# Altium footprint library PcbLib.PcbLib: 154 footprints (part 4 of 10)
Each footprint in its own frame and in the unit in brackets; x right, y up, seen from the top. Pads: shape width x height; smd on the part's side, far side on the other; paste and mask are expansions set on the pad; w line width, h text height; cw(c..) or ccw(c..) is an arc to the next point about the centre after c.
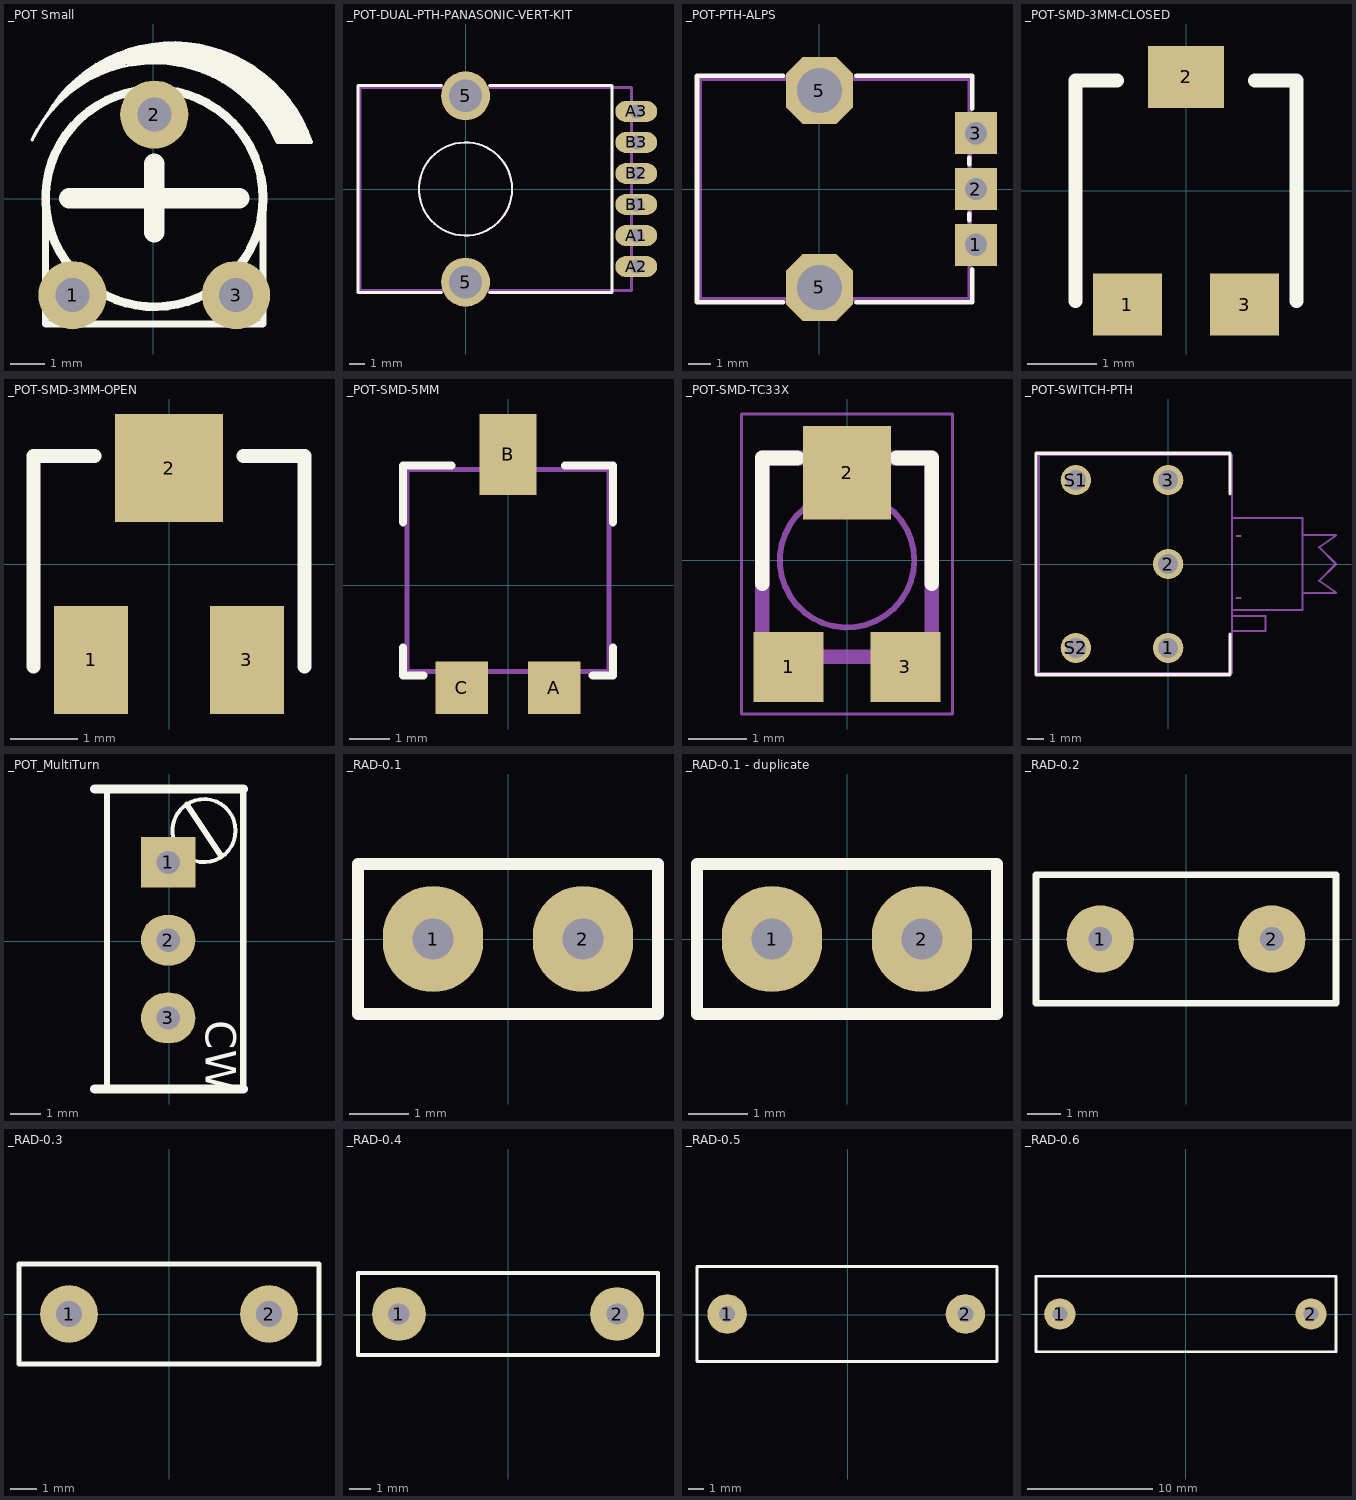
[diagram p3: the footprints below, top view; thin cyan lines are the x and y axes]

## _POT Small [mm]
pads (3):
  round 2 hole 1: 1(-2.375,-2.828) 2(0.025,2.472) 3(2.425,-2.828)
Top Overlay:
  circle w0.254: c0.025,0.022 r3.19
  lines w0.1: -3.557,1.733 cw(c0.025,0.022) 3.644,1.655 4.621,1.655 ; -3.141,2.43 cw(c0.572,0.288) 4.635,1.652 ; -2.725,2.955 -2.455,3.202 ; -2.525,3.222 -2.385,3.222 ; -2.455,3.292 -2.265,3.292 ; -2.375,3.382 -2.135,3.382 ; -2.285,3.472 -1.985,3.472 ; -2.155,3.562 -1.805,3.562 ; -2.065,3.652 -1.605,3.652 ; -1.935,3.742 -1.415,3.742 ; -1.845,3.822 -1.145,3.822 ; -1.695,3.912 -0.845,3.912 ; -1.565,4.002 2.673,4.002 ; -1.385,4.092 2.513,4.092 ; -1.225,4.172 2.343,4.182 ; -1.045,4.252 2.163,4.262 ; -0.815,4.342 1.943,4.342 ; -0.495,4.432 1.593,4.432 ; -0.145,4.492 1.263,4.492 ; 0.835,3.912 2.823,3.912 ; 1.185,3.822 2.963,3.822 ; 1.435,3.732 3.083,3.732 ; 1.675,3.642 3.203,3.642 ; 1.865,3.552 3.313,3.552 ; 2.165,3.372 3.503,3.372 ; 2.325,3.282 3.603,3.282 ; 2.565,3.102 3.743,3.102 ; 2.785,2.932 3.903,2.932 ; 2.955,2.742 3.993,2.742 ; 3.075,2.672 4.053,2.672 ; 3.115,2.602 4.093,2.602 ; 3.175,2.532 4.153,2.532 ; 3.235,2.452 4.213,2.452 ; 3.345,2.262 4.323,2.262 ; 3.415,2.172 4.393,2.172 ; 3.445,2.082 4.423,2.082 ; 3.495,1.992 4.473,1.992 ; 3.525,1.912 4.503,1.912 ; 3.575,1.822 4.553,1.822 ; 3.605,1.742 4.583,1.742
  lines w0.12: 2.025,3.462 3.433,3.462 ; 2.445,3.192 3.683,3.192 ; 2.705,3.022 3.823,3.022 ; 2.845,2.842 3.963,2.842
  lines w0.15: 3.285,2.362 4.263,2.362
  lines w0.2: -3.165,0.222 -3.165,-3.678 3.215,-3.678 3.215,0.222
  lines w0.6: -2.475,0.022 2.525,0.022 ; 0.025,-0.978 0.025,1.022

## _POT-DUAL-PTH-PANASONIC-VERT-KIT [mm]
pads (8):
  round 3.15 hole 2.1: 5(0,-6) 5(0,6)
  oval 2.7x1.35 hole 0.9: A1(11,-3) A2(11,-5) A3(11,5) B1(11,-1) B2(11,1) B3(11,3)
Top Overlay:
  circle w0.127: c0,0 r3
  lines w0.203: -1.55,-6.677 -6.927,-6.677 -6.927,6.677 -1.55,6.677 ; 1.55,-6.677 9.43,-6.677 9.43,6.677 1.55,6.677
Top Solder:
  circle w0: c0,6 r1.05
  circle w0: c0,-6 r1.05
  circle w0: c11,5 r0.45
  circle w0: c11,3 r0.45
  circle w0: c11,1 r0.45
  circle w0: c11,-1 r0.45
  circle w0: c11,-3 r0.45
  circle w0: c11,-5 r0.45
Bottom Solder:
  drawing of 8 lines, arcs and shapes, not listed
Mechanical 16:
  circle w0.127: c0,0 r3
  lines w0.203: -6.8,-6.55 10.7,-6.55 10.7,6.55 -6.8,6.55 -6.8,-6.55

## _POT-PTH-ALPS [mm]
pads (5):
  rect 1.88x1.88 hole 1: 1(7,-2.5) 2(7,0) 3(7,2.5)
  oct 3x3 hole 2: 5(0,-4.4) 5(0,4.4)
Top Overlay:
  lines w0.203: -1.625,-5.057 -5.473,-5.057 -5.473,5.057 -1.625,5.057 ; 1.639,-5.057 6.827,-5.057 ; 1.64,5.057 6.827,5.057 6.827,3.6 ; 6.7,-1.4 6.7,-1.1 ; 6.7,1.1 6.7,1.4 ; 6.827,-5.027 6.827,-3.6
Mechanical 16:
  lines w0.203: -5.346,-4.93 -5.346,4.93 6.73,4.93 6.73,-4.93 -5.346,-4.93

## _POT-SMD-3MM-CLOSED [mm]
pads (3):
  rect 1x0.9 smd: 1(-0.85,-1.65) 3(0.85,-1.65)
  rect 1.1x0.9 smd: 2(0,1.65)
Top Overlay:
  lines w0.203: -1.6,-1.6 -1.6,1.6 -1,1.6 ; 1,1.6 1.6,1.6 1.6,-1.6

## _POT-SMD-3MM-OPEN [mil]
pads (3):
  rect 43x63 smd: 1(-45.46,-55.96) 3(45.46,-55.96)
  rect 63x63 smd: 2(0,55.96)
Top Overlay:
  lines w8: -78.99,-59.99 -78.99,62.99 -43.37,62.99 ; 43.37,62.99 78.99,62.99 78.99,-59.99

## _POT-SMD-5MM [mm]
pads (3):
  rect 1.3x1.3 smd: A(1.15,-2.54) C(-1.15,-2.54)
  rect 1.402x2 smd: B(0,3.238)
Top Overlay:
  lines w0.203: -2.6,-1.54 -2.6,-2.24 -2.094,-2.24 ; -2.6,1.56 -2.6,2.96 -1.4,2.96 ; 1.409,2.96 2.6,2.96 2.6,1.56 ; 2.1,-2.24 2.6,-2.24 2.6,-1.54
Mechanical 16:
  lines w0.127: -2.5,-2.14 2.5,-2.14 2.5,2.86 -2.5,2.86 -2.5,-2.14

## _POT-SMD-TC33X [mm]
pads (3):
  rect 1.2x1.2 smd: 1(-1,-1.825) 3(1,-1.825)
  rect 1.5x1.6 smd: 2(0,1.5)
Top Overlay:
  lines w0.254: -1.45,-0.4 -1.45,1.75 -0.85,1.75 ; 0.85,1.75 1.45,1.75 1.45,-0.4
Mechanical 16:
  circle w0.102: c0,0 r1.15
  lines w0.254: -1.45,-1.65 -1.45,1.75 1.45,1.75 1.45,-1.65 -1.45,-1.65
Mechanical 27:
  lines w0.051: -1.803,-2.629 1.803,-2.629 1.803,2.502 -1.803,2.502 -1.803,-2.629

## _POT-SWITCH-PTH [mm]
pads (5):
  round 1.8 hole 1.2: 1(0,-5) 2(0,0) 3(0,5) S1(-5.5,5) S2(-5.5,-5)
Top Overlay:
  lines w0.203: 3.683,-4.191 3.683,-6.604 -7.874,-6.604 -7.874,6.604 3.683,6.604 3.683,4.191
Mechanical 16:
  lines w0.127: 4.064,-2.016 4.318,-2.016 ; 4.064,1.667 4.318,1.667 ; 10,-1.73 8,-1.73 ; 10,-1.7 9,-1 10,0 9,1 10,1.7 ; 10,1.73 8,1.73 ; 3.8,-4 5.8,-4 5.8,-3.1 3.8,-3.1 ; 3.8,-4 3.8,-6.5 -7.7,-6.5 -7.7,6.5 3.8,6.5 3.8,2.73 ; 3.8,-4 3.8,-3.1 ; 3.8,-3.1 3.8,-2.73 ; 3.8,-2.73 8,-2.73 8,-1.73 ; 3.8,-2.73 3.8,2.73 ; 3.8,2.73 8,2.73 8,1.73 ; 8,-1.73 8,1.73
  text "mounting surface" at 4.699,-2.27 h0.63

## _POT_MultiTurn [mil]
pads (3):
  rect 70x65 hole 30: 1(-1,101)
  oval 70x65 hole 30: 2(-1,1) 3(-1,-99)
Top Overlay:
  circle w5: c45.03,141.94 r40.58
  lines w7.87: -79.74,-190.34 -79.74,195.49 ; 23.02,175.41 66.72,109.66 ; 95.46,-190.34 95.46,195.49
  lines w11.81: -95.49,-190.34 95.46,-190.34 ; -95.49,195.49 95.46,195.49
  text "CW" at 47,-102 h39.37

## _RAD-0.1 [mm] "2.54mm"
pads (2):
  oval 1.7x1.8 hole 0.7: 1(-1.27,0) 2(1.27,0)
Top Overlay:
  lines w0.2: -2.54,-1.27 2.54,-1.27 2.54,1.27 -2.54,1.27 -2.54,-1.27

## _RAD-0.1 - duplicate [mm] "2.54mm"
pads (2):
  oval 1.7x1.8 hole 0.7: 1(-1.27,0) 2(1.27,0)
Top Overlay:
  lines w0.2: -2.54,-1.27 -2.54,1.27 2.54,1.27 2.54,-1.27 -2.54,-1.27

## _RAD-0.2 [mm] "5.08mm"
pads (2):
  round 2 hole 0.7: 1(-2.54,0) 2(2.54,0)
Top Overlay:
  lines w0.2: -4.445,-1.905 -4.445,1.905 4.445,1.905 4.445,-1.905 -4.445,-1.905

## _RAD-0.3 [mm] "7.62mm"
height 6
pads (2):
  round 2.2 hole 1: 1(-3.81,0) 2(3.81,0)
Top Overlay:
  lines w0.2: -5.715,-1.905 5.715,-1.905 5.715,1.905 -5.715,1.905 -5.715,-1.905

## _RAD-0.4 [mm] "10.16mm"
pads (2):
  round 2.5 hole 1: 1(-5.08,0.025) 2(5.08,0.025)
Top Overlay:
  lines w0.2: -6.985,-1.88 -6.985,1.93 6.985,1.93 6.985,-1.88 -6.985,-1.88

## _RAD-0.5 [mm] "15.11mm"
pads (2):
  round 2.5 hole 1: 1(-7.62,0.051) 2(7.46,0.051)
Top Overlay:
  lines w0.2: -9.525,-2.949 9.46,-2.949 9.46,3.051 -9.525,3.051 -9.525,-2.949

## _RAD-0.6 [mm] "20.20mm"
pads (2):
  round 2.5 hole 1.2: 1(-10.058,0.025) 2(10.022,0.025)
Top Overlay:
  lines w0.2: -11.963,-2.975 -11.963,3.025 12.022,3.025 12.022,-2.975 -11.963,-2.975